# Altium footprint library PCB_Lib_Devzone.PcbLib: 491 footprints (part 17 of 31)
Each footprint in its own frame and in the unit in brackets; x right, y up, seen from the top. Pads: shape width x height; smd on the part's side, far side on the other; paste and mask are expansions set on the pad; w line width, h text height; cw(c..) or ccw(c..) is an arc to the next point about the centre after c.
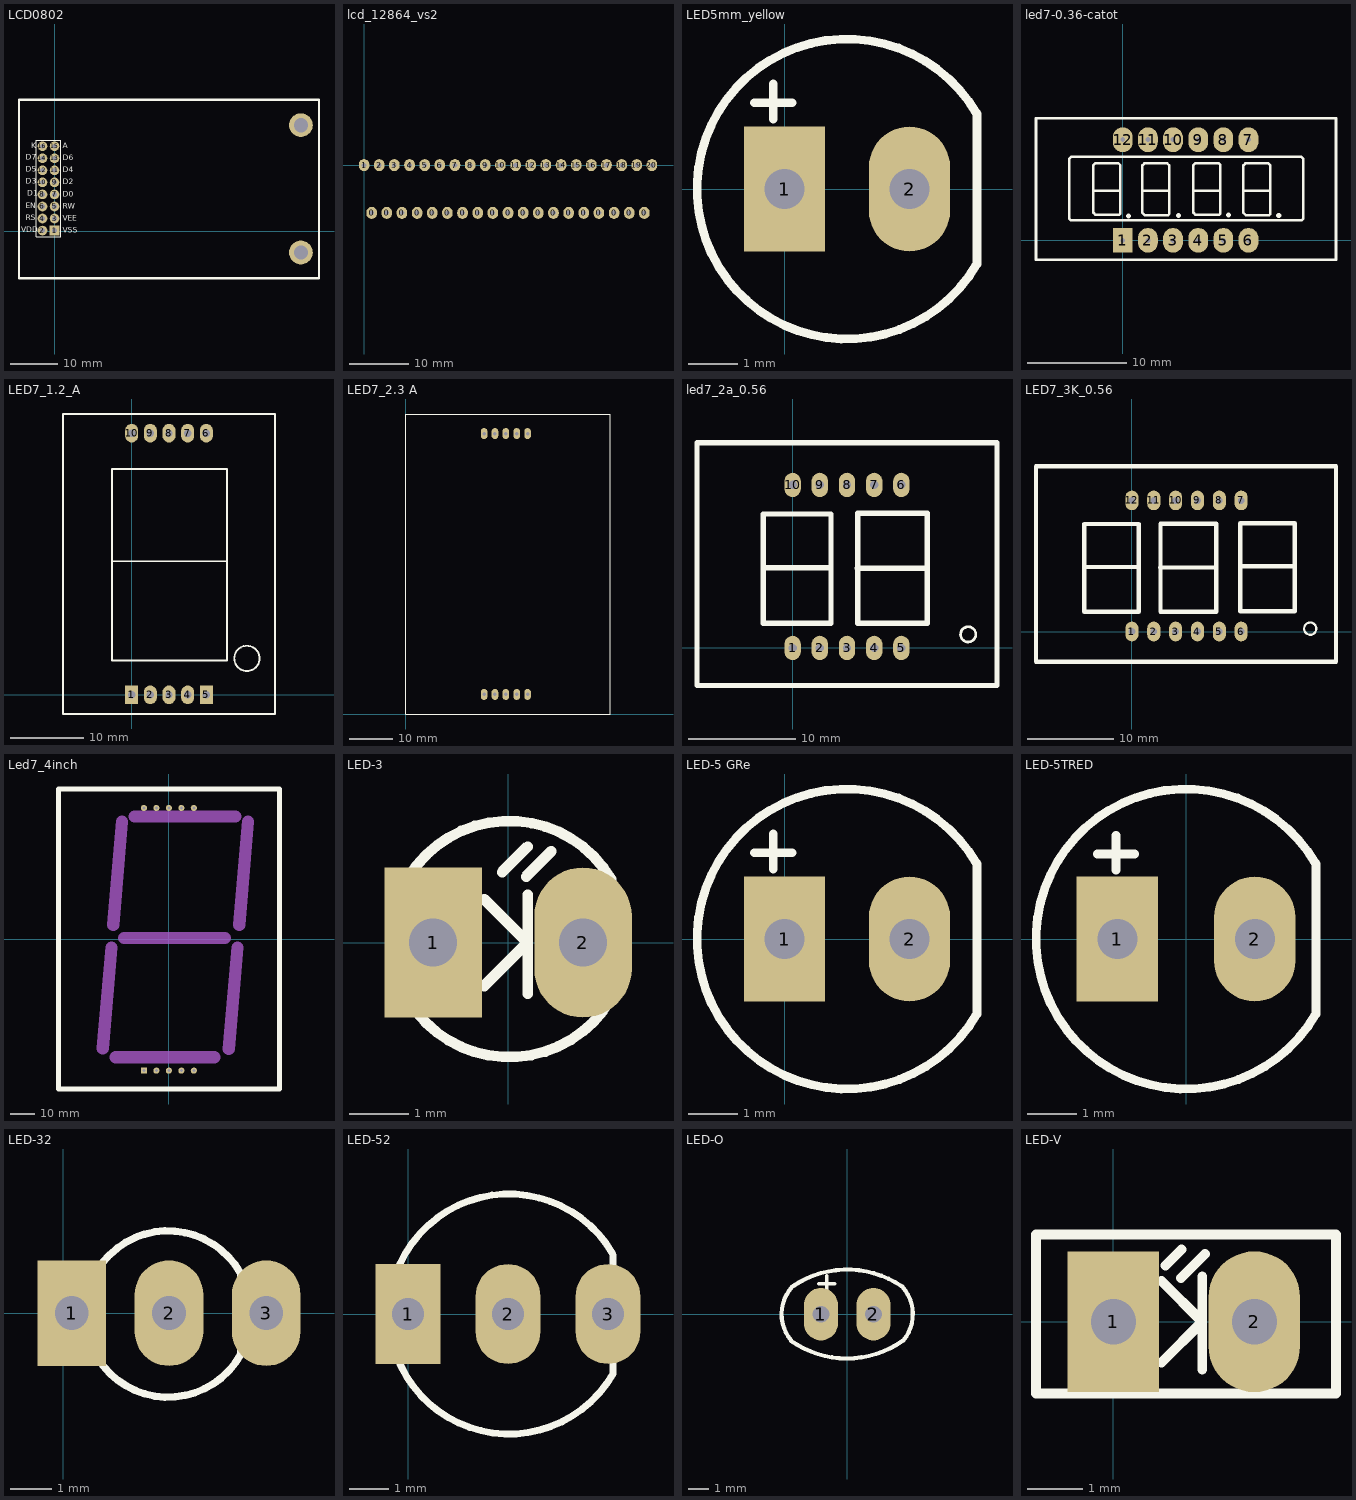
[diagram p16: the footprints below, top view; thin cyan lines are the x and y axes]

## LCD0802 [mil]
pads (20):
  rect 80x80 hole 39.37: 1(0,5)
  round 80 hole 39.37: 2(-100,5) 3(0,105) 4(-100,105) 5(0,205) 6(-100,205) 7(0,305) 8(-100,305) 9(0,405) 10(-100,405) 11(0,505) 12(-100,505) 13(0,605) 14(-100,605) 15(0,705) 16(-100,705)
  round 0 all layers, no hole mask+50: ""(-47.91,-177.09) ""(-47.91,880)
  round 196.85 hole 118.11 mask+50: ""(2045,-177.09) ""(2045,880)
Top Overlay:
  lines w7.87: -150,-45 50,-45 50,755 -150,755 -150,-45
  lines w20: -295,-390 2195,-390 2195,1090 -295,1090 -295,-390
  text "VSS" at 68.06,-15 h45
  text "VDD" at -275,-10 h45
  text "VEE" at 68.06,85.71 h45
  text "D0" at 68.06,287.14 h45
  text "D1" at -225,292.14 h45
  text "D2" at 68.06,387.86 h45
  text "D3" at -240,392.86 h45
  text "D4" at 68.06,488.57 h45
  text "D5" at -240,493.57 h45
  text "D6" at 68.06,589.29 h45
  text "D7" at -240,594.29 h45
  text "RS" at -240,90.71 h45
  text "RW" at 68.06,186.43 h45
  text "EN" at -240,191.43 h45
  text "A" at 68.06,690 h45
  text "K" at -195.01,690 h45

## lcd_12864_vs2 [mil]
pads (39):
  oval 70x80 hole 31.5: 0(50,-314.96) 0(150,-314.96) 0(250,-314.96) 0(350,-314.96) 0(450,-314.96) 0(550,-314.96) 0(650,-314.96) 0(750,-314.96) 0(850,-314.96) 0(950,-314.96) 0(1050,-314.96) 0(1150,-314.96) 0(1250,-314.96) 0(1350,-314.96) 0(1450,-314.96) 0(1550,-314.96) 0(1650,-314.96) 0(1750,-314.96) 0(1850,-314.96) 1(0,0) 2(100,0) 3(200,0) 4(300,0) 5(400,0) 6(500,0) 7(600,0) 8(700,0) 9(800,0) 10(900,0) 11(1000,0) 12(1100,0) 13(1200,0) 14(1300,0) 15(1400,0) 16(1500,0) 17(1600,0) 18(1700,0) 19(1800,0) 20(1900,0)

## LED5mm_yellow [mil]
pads (2):
  rect 65x100 hole 32: 1(0,0)
  oval 65x100 hole 32: 2(100,0)
Top Overlay:
  lines w7: -24,69 6,69 ; -9,56 -9,84 ; 153.51,60.71 ccw(c50,0) 153.94,-59.97 ; 154,-59 154,60
3D body "SW3dPS-LEDd5Y.STEP": height 346.96, standoff -235.72, extent -67.31,-118.49 146.08,118.5

## led7-0.36-catot [mm]
pads (12):
  rect 2x2.5 hole 0.5: 1(0,0)
  oval 2x2.5 hole 0.5: 2(2.54,0) 3(5.08,0) 4(7.62,0) 5(10.16,0) 6(12.7,0) 7(12.7,10.16) 8(10.16,10.16) 9(7.62,10.16) 10(5.08,10.16) 11(2.54,10.16) 12(0,10.16)
Top Overlay:
  lines w0.254: -2.972,5.029 -2.292,5.029 -0.933,5.029 -0.254,5.029 ; 1.981,5.004 2.661,5.004 4.02,5.004 4.699,5.004 ; 7.137,5.029 7.817,5.029 9.176,5.029 9.855,5.029 ; 12.192,5.004 12.871,5.004 14.23,5.004 14.91,5.004 ; -8.763,-1.956 -8.763,12.319 21.539,12.319 21.539,-1.956 -8.763,-1.956 ; -5.41,2.184 -5.41,8.23 -5.182,8.458 18.009,8.458 18.212,8.255 18.212,2.159 18.059,2.007 -5.232,2.007 -5.41,2.184 ; -2.972,2.794 -2.972,7.595 -2.769,7.798 -0.457,7.798 -0.254,7.595 -0.254,2.692 -0.381,2.565 -2.743,2.565 -2.972,2.794 ; 1.981,2.769 2.21,2.54 4.572,2.54 4.699,2.667 4.699,7.569 4.496,7.772 2.184,7.772 1.981,7.569 1.981,2.769 ; 7.137,2.794 7.366,2.565 9.728,2.565 9.855,2.692 9.855,7.595 9.652,7.798 7.341,7.798 7.137,7.595 7.137,2.794 ; 12.192,2.769 12.421,2.54 14.783,2.54 14.91,2.667 14.91,7.569 14.707,7.772 12.395,7.772 12.192,7.569 12.192,2.769
  lines w0.508: 0.559,2.464 0.584,2.464 ; 5.613,2.489 5.639,2.489 ; 10.668,2.54 10.693,2.54 ; 15.748,2.515 15.773,2.515
3D body "User Library-7-seg-4_asm.STEP": height 7.24, standoff -5.96, extent -8.599,-1.808 21.401,12.192

## LED7_1.2_A [mm]
pads (10):
  rect 1.778x2.54 hole 1: 1(0,0) 5(10.16,0)
  oval 1.778x2.54 hole 1: 2(2.54,0) 3(5.08,0) 4(7.62,0) 6(10.16,35.58) 7(7.62,35.58) 8(5.08,35.58) 9(2.54,35.58) 10(0,35.58)
Top Overlay:
  circle w0.254: c15.68,4.953 r1.719
  lines w0.254: -2.616,18.161 12.903,18.161 ; -9.32,-2.61 19.48,-2.61 19.48,38.19 -9.32,38.19 -9.32,-2.61 ; -2.667,4.648 12.979,4.648 12.979,30.709 -1.88,30.709 -2.667,30.709 -2.667,4.648

## LED7_2.3 A [mil]
pads (10):
  oval 60x100 hole 32: 1(708.66,177.17) 2(807.09,177.17) 3(905.51,177.17) 4(1003.94,177.17) 5(1102.36,177.17) 6(1102.36,2539.37) 7(1003.94,2539.37) 8(905.51,2539.37) 9(807.09,2539.37) 10(708.66,2539.37)
Top Overlay:
  lines w7: 0,0 1850.39,0 ; 0,2716.54 1850.39,2716.54
  lines w10: 0,0 0,2716.54 ; 1850.39,0 1850.39,2716.54

## led7_2a_0.56 [mil]
pads (10):
  oval 60x90 hole 31: 1(0,0) 2(100,0) 3(200,0) 4(300,0) 5(400,0) 6(400,600) 7(300,600) 8(200,600) 9(100,600) 10(0,600)
Top Overlay:
  lines w10: 669,66 ccw(c646,50) 672.18,59.97
  lines w20: -109,296 139,296 ; 238,294 489,294 ; -352,-138 -352,756 752,756 752,-138 -352,-138 ; -109,91 141,91 141,493 -109,493 -109,91 ; 240,91 240,495 495,495 495,91 240,91

## LED7_3K_0.56 [mil]
pads (12):
  oval 60x90 hole 31: 1(0,0) 2(100,0) 3(200,0) 4(300,0) 5(400,0) 6(500,0) 7(500,600) 8(400,600) 9(300,600) 10(200,600) 11(100,600) 12(0,600)
Top Overlay:
  lines w10: 839,29 ccw(c816,13) 842.18,22.97
  lines w20: -218,295 30,295 ; 129,293 380,293 ; 495,298 743,298 ; -439,-138 -439,756 934,756 934,-138 -439,-138 ; -218,90 32,90 32,492 -218,492 -218,90 ; 131,90 131,494 386,494 386,90 131,90 ; 495,93 495,495 745,495 745,93 495,93

## Led7_4inch [mm]
pads (10):
  rect 2.5x2.5 hole 1.2: 1(-10.16,-53.492)
  round 2.5 hole 1.2: 2(-5.08,-53.492) 3(0,-53.492) 4(5.08,-53.492) 5(10.16,-53.492) 6(10.16,53.492) 7(5.08,53.492) 8(0,53.492) 9(-5.08,53.492) 10(-10.16,53.492)
Top Overlay:
  lines w2: -44.959,-60.96 45.084,-60.96 45.084,-50.273 45.084,-40.43 45.084,61.214 -44.959,61.214 -44.959,-60.96
Mechanical 1:
  lines w5: -26.925,-44.45 -23.369,-3.302 ; -22.607,5.842 -19.094,48.01 ; -21.591,-48.006 18.541,-48.006 ; -18.289,0.508 22.859,0.508 ; -13.971,50.038 27.177,50.038 ; 24.383,-44.704 27.939,-3.302 ; 28.701,5.842 32.214,48.01

## LED-3 [mil] "LED 2 PIN, 3ly Only colour"
height 300
pads (2):
  rect 65x100 hole 32: 1(-50,0)
  oval 65x100 hole 32: 2(50,0)
Top Overlay:
  lines w7: -16,-29 13,0 -16,29 ; -4,47 13,64 ; 12,44 29,61 ; 13,-34 13,32 ; 67.92,-39.35 67.92,39.84
  lines w7.01: 68.57,-37.74 cw(c0.8,2.35) 68.72,42.19
3D body "SW3DPS-LED DIP 3MM-DEFAULT.STEP": height 217.14, standoff -117.51, extent -61.99,-74.8 75.8,74.81

## LED-5 GRe [mil] "LED 2 PIN, 5 ly , Only colour,pin to pin 100mil"
height 300
pads (2):
  rect 65x100 hole 32: 1(0,0)
  oval 65x100 hole 32: 2(100,0)
Top Overlay:
  lines w7: -24,69 6,69 ; -9,56 -9,84 ; 153.51,60.71 ccw(c50,0) 153.94,-59.97 ; 154,-59 154,60
3D body "SW3dPS-LED green.STEP": height 336.82, standoff -117.51, extent -54.33,-103.65 154.33,105.01

## LED-5TRED [mil] "LED 2 PIN, 5 ly , Only colour, pin to pin 110mil"
height 300
pads (2):
  rect 65x100 hole 32: 1(-55,0)
  oval 65x100 hole 32: 2(55,0)
Top Overlay:
  lines w7: -71,68 -41,68 ; -56,55 -56,83 ; 103.51,60.71 ccw(c0,0) 103.94,-59.97 ; 104,-59 104,60
3D body "SW3dPS-LEDd5R.STEP": height 339.18, standoff -243.49, extent -115.69,-117 97.7,120

## LED-32 [mil] "LED 3 PIN, 3ly Two colour"
height 300
pads (3):
  rect 65x100 hole 32: 1(8,0)
  oval 65x100 hole 32: 2(100,0) 3(192,0)
Top Overlay:
  lines w7: 168,-39 168,37
  lines w7.01: 167.87,37.48 ccw(c99.08,-0.84) 167.97,-38.98

## LED-52 [mil] "LED 3 PIN, 5 ly , Two colour"
height 300
pads (3):
  rect 65x100 hole 32: 1(0,0)
  oval 65x100 hole 32: 2(100,0) 3(200,0)
Top Overlay:
  lines w7: 204.51,60.71 ccw(c101,0) 204.94,-59.97 ; 205,-59 205,59

## LED-O [mil] "LED 2 PIN,  Ovan Only colour, pin to pin 110mil"
height 300
pads (2):
  oval 65x100 hole 32: 1(-50,0) 2(50,0)
Top Overlay:
  lines w7: -54,58 -24,58 ; -39,43 -39,73
  lines w8: -106.82,-49.85 cw(c-47,0) -104.5,52.5 ; -106.38,-51.11 ccw(c-0.81,100.81) 104.97,-50.96 ; -102.83,53.79 cw(c0,-100) 103.93,53.04 ; 104.5,52.5 cw(c47,0) 106.82,-49.85

## LED-V [mil] "LED 2 PIN, Rectang Only colour"
height 300
pads (2):
  rect 65x100 hole 32: 1(0,0)
  oval 65x100 hole 32: 2(100,0)
Top Overlay:
  lines w7: 34,-29 63,0 34,29 ; 37,40 48.3,51.3 ; 48,31 65,48 ; 63,-34 63,32 ; -55,-51 -55,62 158,62 158,-51 -55,-51